# Altium schematic symbol library LATTICEPLDS_Library.SchLib: 291 symbols (part 8 of 32)
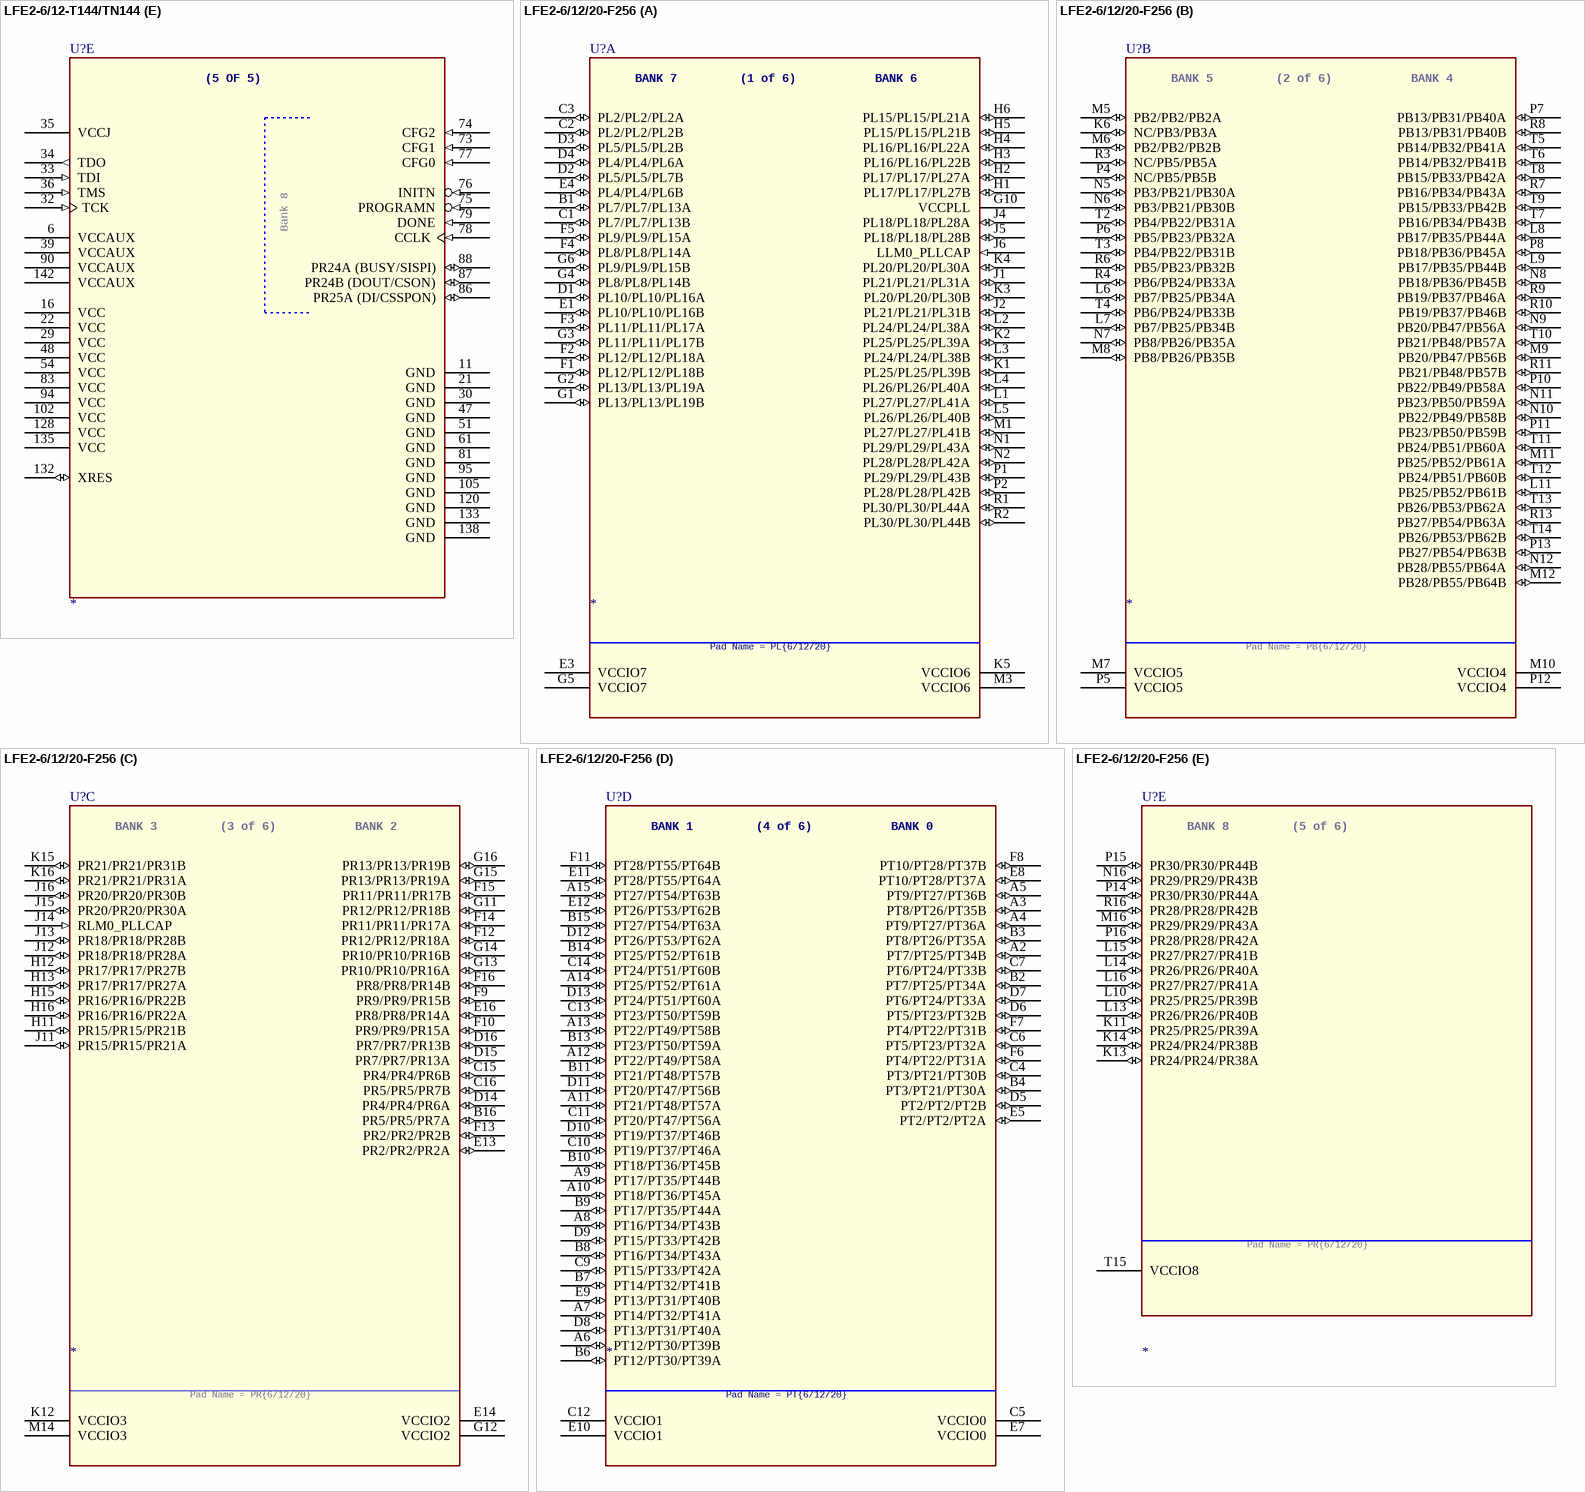
[diagram p310: symbols LFE2-6/12-T144/TN144 to LFE2-6/12/20-F256]

## LFE2-6/12-T144/TN144
designator U?
SWAP_INFO: (S1+S2+S3+S4+S5); SPLIT_INST: TRUE
part A pins: 1 PL2A (VREF2_7) (io), 2 PL2B (VREF1_7) (io), 3 PL4A (io), 4 PL4B (io), 5 PL6A (io), 7 PL6B (io), 8 PL8A (io), 9 VCCIO7 (power), 10 PL8B (io), 12 PL12A (io), 13 PL12B (io), 14 PL13A (PCLKT7_0) (io), 15 PL13B (PCLKC7_0) (io), 17 PL15A (PCLKT6_0) (io), 18 PL15B (PCLKC6_0) (io), 19 PL16A (VREF2_6) (io), 20 PL16B (VREF1_6) (io), 23 PL18A (LLM0_GDLLT_FB_A) (io), 24 PL18B (LLM0_GDLLC_FB_A) (io), 25 LLM0_PLLCAP (io), 26 PL20A (LLM0_GPLLT_IN_A**) (io), 27 PL20B (LLM0_GPLLC_IN_A**) (io), 28 PL22A (io), 31 VCCIO6 (power)
part B pins: 37 PB2A (VREF2_5) (io), 38 PB2B (VREF1_5) (io), 40 PB4A/6A (BDQS6**) (io), 41 PB4B/6B (io), 42 VCCIO5 (power), 43 PB6A (BDQS6*) /12A (io), 44 PB6B/12B (io), 45 NC/PB16A (io), 46 NC/PB16B (io), 49 PB8A/26A (PCLKT5_0) (io), 50 PB8B/26B (PCLKC5_0) (io), 52 PB13A/31A (PCLKT4_0) (io), 53 PB13B/31B (PCLKC4_0) (io), 55 PB14A/34A (io), 56 PB14B/34B (io), 57 PB16A/40A (io), 58 PB16B/40B (io), 59 PB18A/44A (io), 60 PB18B/44B (io), 62 PB20A/48A (io), 63 PB20B/48B (io), 64 VCCIO4 (power), 65 PB22A/50A (io), 66 PB22B/50B (io), 67 PB24A (BDQS24*) /52A (io), 68 PB24B/52B (io), 69 PB26A/54A (io), 70 PB26B/54B (io), 71 PB28A/55A (VREF2_4) (io), 72 PB28B/55B (VREF1_4) (io)
part C pins: 80 PR29A (D0) (io), 82 PR26A (D6) (io), 84 PR25B (D7) (io), 85 VCCIO8 (power), 89 VCCIO3 (power), 91 PR20B (RLM0_GPLLC_IN_A**) (io), 92 PR20A (RLM0_GPLLT_IN_A**) (io), 93 RLM0_PLLCAP (io), 96 PR17B (RLM0_GDLLC_IN_A**) (io), 97 PR17A (RLM0_GDLLT_IN_A**) (io), 98 PR16B (VREF2_3) (io), 99 PR16A (VREF1_3) (io), 100 PR15B (PCLKC3_0) (io), 101 PR15A (PCLKT3_0) (io), 103 PR13B (PCLKC2_0) (io), 104 PR13A (PCLKT2_0) (io), 106 VCCIO2 (power), 107 PR2B (VREF2_2) (io), 108 PR2A (VREF1_2) (io)
part D pins: 109 PT28B/55B (VREF2_1) (io), 110 PT28A/55A (VREF1_1) (io), 111 PT26B/54B (io), 112 PT26A/54A (io), 113 PT24B/52B (io), 114 PT24A/52A (io), 115 PT22B/50B (io), 116 PT22A/50A (io), 117 VCCIO1 (power), 118 PT20B/48B (io), 119 PT20A/48A (io), 121 PT18B/44B (io), 122 PT18A/44A (io), 123 PT16A/40B (io), 124 NC/PT40A (io), 125 PT14B/34B (io), 126 PT14A/34A (io), 127 NC (io), 129 PT12B/30B (PCLKC1_0) (io), 130 PT12A/30A (PCLKT1_0) (io), 131 PT10B/28B (PCLKC0_0) (io), 134 PT10A/28A (PCLKT0_0) (io), 136 PT6B/16B (io), 137 PT6A/16A (io), 139 VCCIO0 (power), 140 PT4B/T6B (io), 141 PT4A/T6A (io), 143 PT2B (VREF2_0) (io), 144 PT2A (VREF1_0) (io)
part E pins: 6 VCCAUX (power), 11 GND (power), 16 VCC (power), 21 GND (power), 22 VCC (power), 29 VCC (power), 30 GND (power), 32 TCK (in), 33 TDI (in), 34 TDO (out), 35 VCCJ (power), 36 TMS (in), 39 VCCAUX (power), 47 GND (power), 48 VCC (power), 51 GND (power), 54 VCC (power), 61 GND (power), 73 CFG1 (in), 74 CFG2 (in), 75 PROGRAMN (in), 76 INITN (in), 77 CFG0 (in), 78 CCLK (in), 79 DONE (in), 81 GND (power), 83 VCC (power), 86 PR25A (DI/CSSPON) (io), 87 PR24B (DOUT/CSON) (io), 88 PR24A (BUSY/SISPI) (io), 90 VCCAUX (power), 94 VCC (power), 95 GND (power), 102 VCC (power), 105 GND (power), 120 GND (power), 128 VCC (power), 132 XRES (io), 133 GND (power), 135 VCC (power), 138 GND (power), 142 VCCAUX (power)
part A text: BANK 7; (1 OF 5); BANK 6; ** These dedicated input pins / can be used for GPLLs or GDLLs / within the respective quadrant.; Pad name = PL{LFE2-6/LFE2-12}
part B text: BANK 5/8; (2 OF 5); BANK 4; *  LFE2-6 only. / ** LFE2-12 only.; Pad name = PB{LFE2-6/LFE2-12}
part C text: BANK 3/8; (3 OF 5); BANK 2; ** These dedicated input pins / can be used for GPLLs or GDLLs / within the respective quadrant.; Pad name = PR{EC1/EC3/EC6}
part D text: BANK 1; (4 OF 5); BANK 0; Pad name = PT{LFE2-6/LFE2-12}
part E text: (5 OF 5); Bank 8

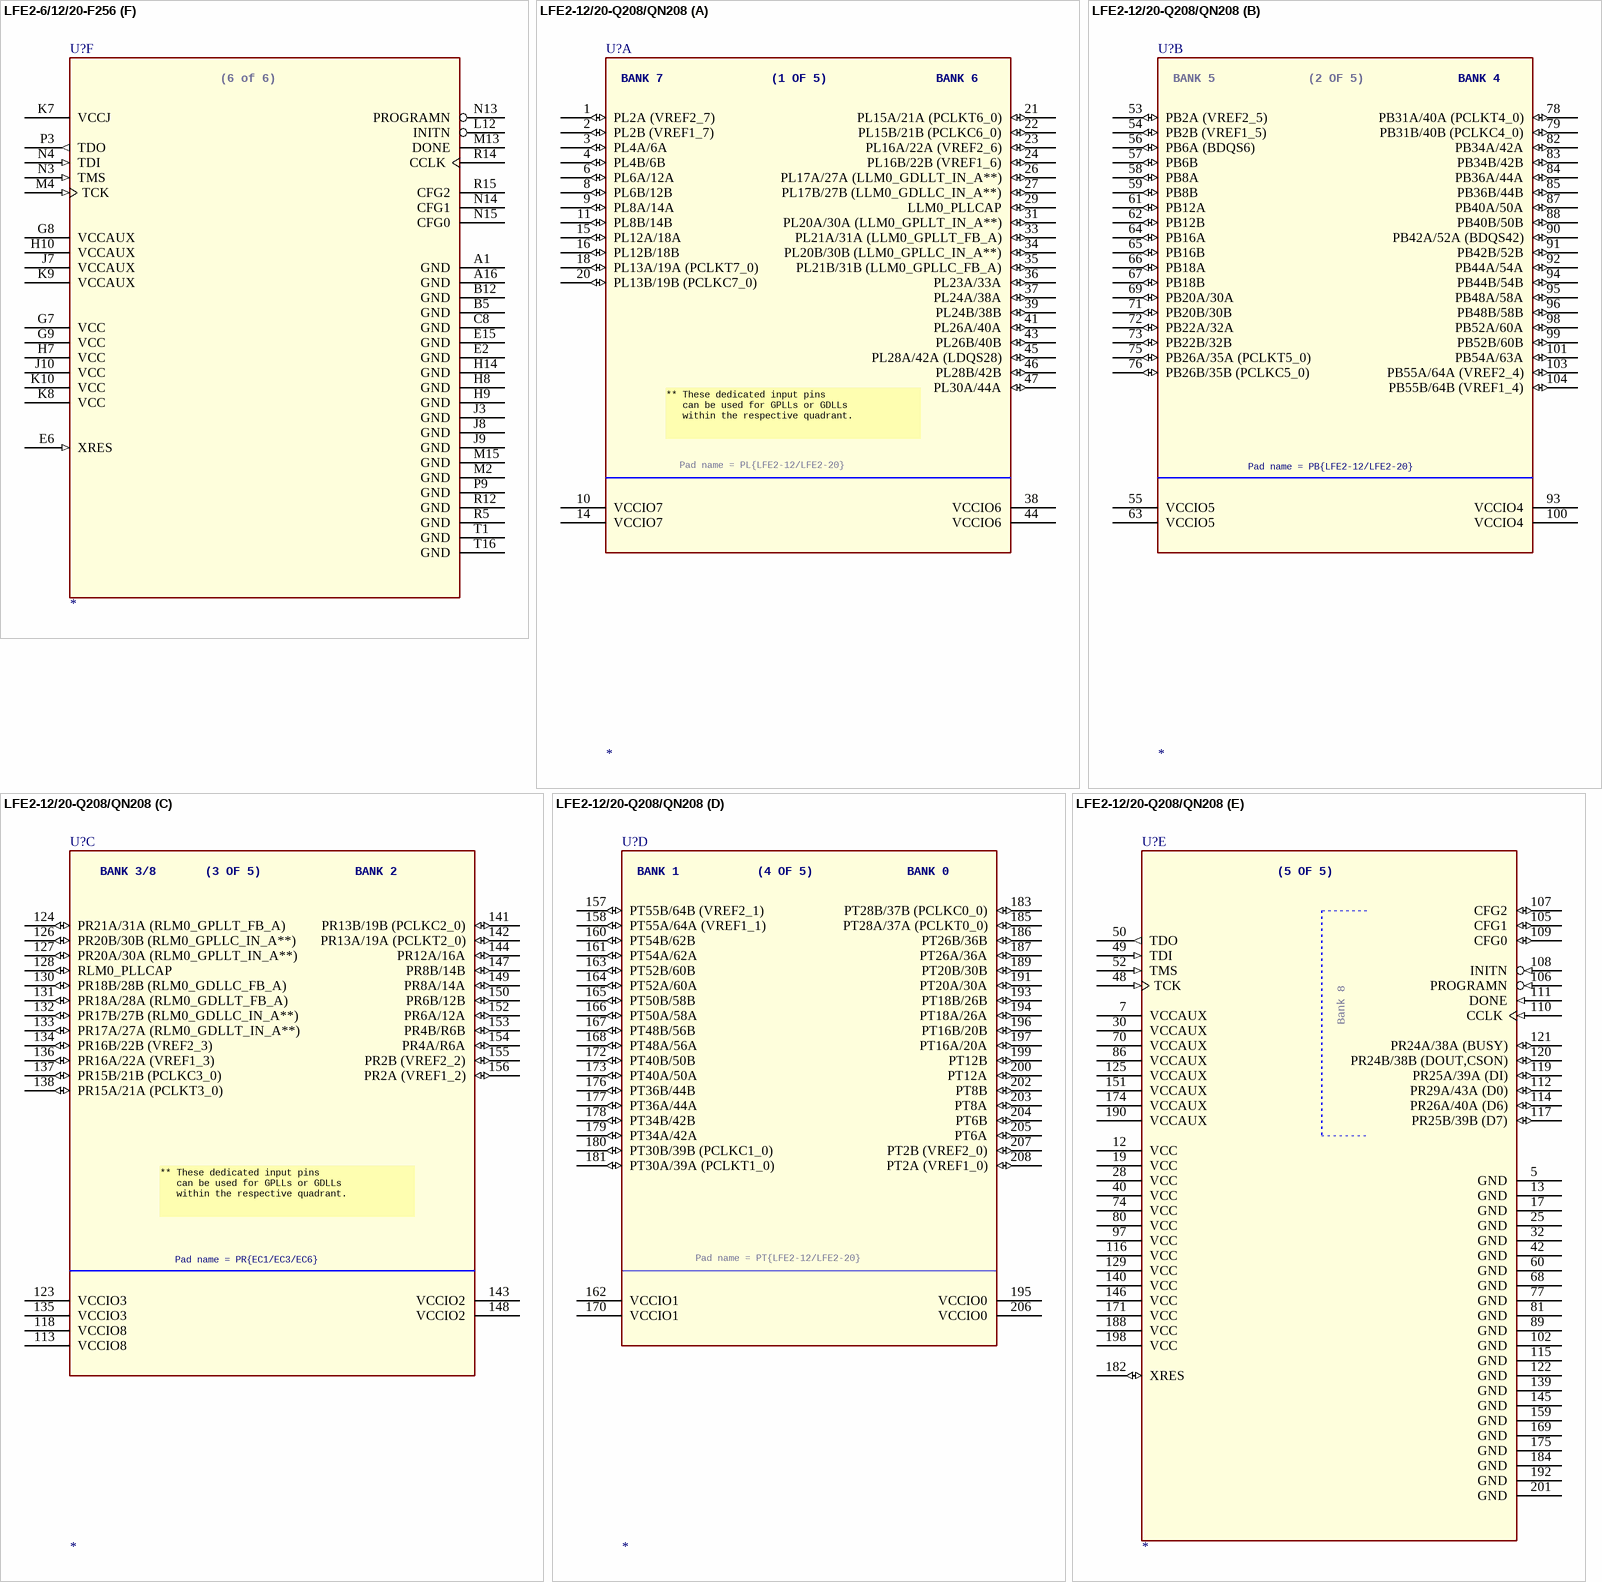
[diagram p77: symbols LFE2-6/12/20-F256 to LFE2-12/20-Q208/QN208]

## LFE2-6/12/20-F256
designator U?
SPLIT_INST: TRUE; SWAP_INFO: (S1+S2+S3+S4+S5+S6)
part A pins: B1 PL7/PL7/PL13A (io), C1 PL7/PL7/PL13B (io), C2 PL2/PL2/PL2B (io), C3 PL2/PL2/PL2A (io), D1 PL10/PL10/PL16A (io), D2 PL5/PL5/PL7B (io), D3 PL5/PL5/PL2B (io), D4 PL4/PL4/PL6A (io), E1 PL10/PL10/PL16B (io), E3 VCCIO7 (power), E4 PL4/PL4/PL6B (io), F1 PL12/PL12/PL18B (io), F2 PL12/PL12/PL18A (io), F3 PL11/PL11/PL17A (io), F4 PL8/PL8/PL14A (io), F5 PL9/PL9/PL15A (io), G1 PL13/PL13/PL19B (io), G2 PL13/PL13/PL19A (io), G3 PL11/PL11/PL17B (io), G4 PL8/PL8/PL14B (io), G5 VCCIO7 (power), G6 PL9/PL9/PL15B (io), G10 VCCPLL (power), H1 PL17/PL17/PL27B (io), H2 PL17/PL17/PL27A (io), H3 PL16/PL16/PL22B (io), H4 PL16/PL16/PL22A (io), H5 PL15/PL15/PL21B (io), H6 PL15/PL15/PL21A (io), J1 PL21/PL21/PL31A (io), J2 PL21/PL21/PL31B (io), J4 PL18/PL18/PL28A (io), J5 PL18/PL18/PL28B (io), J6 LLM0_PLLCAP (in), K1 PL25/PL25/PL39B (io), K2 PL25/PL25/PL39A (io), K3 PL20/PL20/PL30B (io), K4 PL20/PL20/PL30A (io), K5 VCCIO6 (power), L1 PL27/PL27/PL41A (io), L2 PL24/PL24/PL38A (io), L3 PL24/PL24/PL38B (io), L4 PL26/PL26/PL40A (io), L5 PL26/PL26/PL40B (io), M1 PL27/PL27/PL41B (io), M3 VCCIO6 (power), N1 PL29/PL29/PL43A (io), N2 PL28/PL28/PL42A (io), P1 PL29/PL29/PL43B (io), P2 PL28/PL28/PL42B (io), R1 PL30/PL30/PL44A (io), R2 PL30/PL30/PL44B (io)
part B pins: K6 NC/PB3/PB3A (io), L6 PB7/PB25/PB34A (io), L7 PB7/PB25/PB34B (io), L8 PB17/PB35/PB44A (io), L9 PB17/PB35/PB44B (io), L11 PB25/PB52/PB61B (io), M5 PB2/PB2/PB2A (io), M6 PB2/PB2/PB2B (io), M7 VCCIO5 (power), M8 PB8/PB26/PB35B (io), M9 PB20/PB47/PB56B (io), M10 VCCIO4 (power), M11 PB25/PB52/PB61A (io), M12 PB28/PB55/PB64B (io), N5 PB3/PB21/PB30A (io), N6 PB3/PB21/PB30B (io), N7 PB8/PB26/PB35A (io), N8 PB18/PB36/PB45B (io), N9 PB20/PB47/PB56A (io), N10 PB22/PB49/PB58B (io), N11 PB23/PB50/PB59A (io), N12 PB28/PB55/PB64A (io), P4 NC/PB5/PB5B (io), P5 VCCIO5 (power), P6 PB5/PB23/PB32A (io), P7 PB13/PB31/PB40A (io), P8 PB18/PB36/PB45A (io), P10 PB22/PB49/PB58A (io), P11 PB23/PB50/PB59B (io), P12 VCCIO4 (power), P13 PB27/PB54/PB63B (io), R3 NC/PB5/PB5A (io), R4 PB6/PB24/PB33A (io), R6 PB5/PB23/PB32B (io), R7 PB16/PB34/PB43A (io), R8 PB13/PB31/PB40B (io), R9 PB19/PB37/PB46A (io), R10 PB19/PB37/PB46B (io), R11 PB21/PB48/PB57B (io), R13 PB27/PB54/PB63A (io), T2 PB4/PB22/PB31A (io), T3 PB4/PB22/PB31B (io), T4 PB6/PB24/PB33B (io), T5 PB14/PB32/PB41A (io), T6 PB14/PB32/PB41B (io), T7 PB16/PB34/PB43B (io), T8 PB15/PB33/PB42A (io), T9 PB15/PB33/PB42B (io), T10 PB21/PB48/PB57A (io), T11 PB24/PB51/PB60A (io), T12 PB24/PB51/PB60B (io), T13 PB26/PB53/PB62A (io), T14 PB26/PB53/PB62B (io)
part C pins: B16 PR5/PR5/PR7A (io), C15 PR4/PR4/PR6B (io), C16 PR5/PR5/PR7B (io), D14 PR4/PR4/PR6A (io), D15 PR7/PR7/PR13A (io), D16 PR7/PR7/PR13B (io), E13 PR2/PR2/PR2A (io), E14 VCCIO2 (power), E16 PR8/PR8/PR14A (io), F9 PR9/PR9/PR15B (io), F10 PR9/PR9/PR15A (io), F12 PR12/PR12/PR18A (io), F13 PR2/PR2/PR2B (io), F14 PR11/PR11/PR17A (io), F15 PR11/PR11/PR17B (io), F16 PR8/PR8/PR14B (io), G11 PR12/PR12/PR18B (io), G12 VCCIO2 (power), G13 PR10/PR10/PR16A (io), G14 PR10/PR10/PR16B (io), G15 PR13/PR13/PR19A (io), G16 PR13/PR13/PR19B (io), H11 PR15/PR15/PR21B (io), H12 PR17/PR17/PR27B (io), H13 PR17/PR17/PR27A (io), H15 PR16/PR16/PR22B (io), H16 PR16/PR16/PR22A (io), J11 PR15/PR15/PR21A (io), J12 PR18/PR18/PR28A (io), J13 PR18/PR18/PR28B (io), J14 RLM0_PLLCAP (in), J15 PR20/PR20/PR30A (io), J16 PR20/PR20/PR30B (io), K12 VCCIO3 (power), K15 PR21/PR21/PR31B (io), K16 PR21/PR21/PR31A (io), M14 VCCIO3 (power)
part D pins: A2 PT7/PT25/PT34B (io), A3 PT8/PT26/PT35B (io), A4 PT9/PT27/PT36A (io), A5 PT9/PT27/PT36B (io), A6 PT12/PT30/PT39B (io), A7 PT14/PT32/PT41A (io), A8 PT16/PT34/PT43B (io), A9 PT17/PT35/PT44B (io), A10 PT18/PT36/PT45A (io), A11 PT21/PT48/PT57A (io), A12 PT22/PT49/PT58A (io), A13 PT22/PT49/PT58B (io), A14 PT25/PT52/PT61A (io), A15 PT27/PT54/PT63B (io), B2 PT7/PT25/PT34A (io), B3 PT8/PT26/PT35A (io), B4 PT3/PT21/PT30A (io), B6 PT12/PT30/PT39A (io), B7 PT14/PT32/PT41B (io), B8 PT16/PT34/PT43A (io), B9 PT17/PT35/PT44A (io), B10 PT18/PT36/PT45B (io), B11 PT21/PT48/PT57B (io), B13 PT23/PT50/PT59A (io), B14 PT25/PT52/PT61B (io), B15 PT27/PT54/PT63A (io), C4 PT3/PT21/PT30B (io), C5 VCCIO0 (power), C6 PT5/PT23/PT32A (io), C7 PT6/PT24/PT33B (io), C9 PT15/PT33/PT42A (io), C10 PT19/PT37/PT46A (io), C11 PT20/PT47/PT56A (io), C12 VCCIO1 (power), C13 PT23/PT50/PT59B (io), C14 PT24/PT51/PT60B (io), D5 PT2/PT2/PT2B (io), D6 PT5/PT23/PT32B (io), D7 PT6/PT24/PT33A (io), D8 PT13/PT31/PT40A (io), D9 PT15/PT33/PT42B (io), D10 PT19/PT37/PT46B (io), D11 PT20/PT47/PT56B (io), D12 PT26/PT53/PT62A (io), D13 PT24/PT51/PT60A (io), E5 PT2/PT2/PT2A (io), E7 VCCIO0 (power), E8 PT10/PT28/PT37A (io), E9 PT13/PT31/PT40B (io), E10 VCCIO1 (power), E11 PT28/PT55/PT64A (io), E12 PT26/PT53/PT62B (io), F6 PT4/PT22/PT31A (io), F7 PT4/PT22/PT31B (io), F8 PT10/PT28/PT37B (io), F11 PT28/PT55/PT64B (io)
part E pins: K11 PR25/PR25/PR39A (io), K13 PR24/PR24/PR38A (io), K14 PR24/PR24/PR38B (io), L10 PR25/PR25/PR39B (io), L13 PR26/PR26/PR40B (io), L14 PR26/PR26/PR40A (io), L15 PR27/PR27/PR41B (io), L16 PR27/PR27/PR41A (io), M16 PR29/PR29/PR43A (io), N16 PR29/PR29/PR43B (io), P14 PR30/PR30/PR44A (io), P15 PR30/PR30/PR44B (io), P16 PR28/PR28/PR42A (io), R16 PR28/PR28/PR42B (io), T15 VCCIO8 (power)
part F pins: A1 GND (power), A16 GND (power), B5 GND (power), B12 GND (power), C8 GND (power), E2 GND (power), E6 XRES (in), E15 GND (power), G7 VCC (power), G8 VCCAUX (power), G9 VCC (power), H7 VCC (power), H8 GND (power), H9 GND (power), H10 VCCAUX (power), H14 GND (power), J3 GND (power), J7 VCCAUX (power), J8 GND (power), J9 GND (power), J10 VCC (power), K7 VCCJ (power), K8 VCC (power), K9 VCCAUX (power), K10 VCC (power), L12 INITN, M2 GND (power), M4 TCK (in), M13 DONE, M15 GND (power), N3 TMS (in), N4 TDI (in), N13 PROGRAMN, N14 CFG1, N15 CFG0, P3 TDO (out), P9 GND (power), R5 GND (power), R12 GND (power), R14 CCLK, R15 CFG2, T1 GND (power), T16 GND (power)
part A text: BANK 7; (1 of 6); BANK 6; Pad Name = PL{6/12/20}
part B text: BANK 5; (2 of 6); BANK 4; Pad Name = PB{6/12/20}
part C text: BANK 3; (3 of 6); BANK 2; Pad Name = PR{6/12/20}
part D text: BANK 1; (4 of 6); BANK 0; Pad Name = PT{6/12/20}
part E text: BANK 8; (5 of 6); Pad Name = PR{6/12/20}
part F text: (6 of 6)

## LFE2-12/20-Q208/QN208
designator U?
SWAP_INFO: (S1+S2+S3+S4+S5); SPLIT_INST: TRUE
part A pins: 1 PL2A (VREF2_7) (io), 2 PL2B (VREF1_7) (io), 3 PL4A/6A (io), 4 PL4B/6B (io), 6 PL6A/12A (io), 8 PL6B/12B (io), 9 PL8A/14A (io), 10 VCCIO7 (power), 11 PL8B/14B (io), 14 VCCIO7 (power), 15 PL12A/18A (io), 16 PL12B/18B (io), 18 PL13A/19A (PCLKT7_0) (io), 20 PL13B/19B (PCLKC7_0) (io), 21 PL15A/21A (PCLKT6_0) (io), 22 PL15B/21B (PCLKC6_0) (io), 23 PL16A/22A (VREF2_6) (io), 24 PL16B/22B (VREF1_6) (io), 26 PL17A/27A (LLM0_GDLLT_IN_A**) (io), 27 PL17B/27B (LLM0_GDLLC_IN_A**) (io), 29 LLM0_PLLCAP (io), 31 PL20A/30A (LLM0_GPLLT_IN_A**) (io), 33 PL21A/31A (LLM0_GPLLT_FB_A) (io), 34 PL20B/30B (LLM0_GPLLC_IN_A**) (io), 35 PL21B/31B (LLM0_GPLLC_FB_A) (io), 36 PL23A/33A (io), 37 PL24A/38A (io), 38 VCCIO6 (power), 39 PL24B/38B (io), 41 PL26A/40A (io), 43 PL26B/40B (io), 44 VCCIO6 (power), 45 PL28A/42A (LDQS28) (io), 46 PL28B/42B (io), 47 PL30A/44A (io)
part B pins: 53 PB2A (VREF2_5) (io), 54 PB2B (VREF1_5) (io), 55 VCCIO5 (power), 56 PB6A (BDQS6) (io), 57 PB6B (io), 58 PB8A (io), 59 PB8B (io), 61 PB12A (io), 62 PB12B (io), 63 VCCIO5 (power), 64 PB16A (io), 65 PB16B (io), 66 PB18A (io), 67 PB18B (io), 69 PB20A/30A (io), 71 PB20B/30B (io), 72 PB22A/32A (io), 73 PB22B/32B (io), 75 PB26A/35A (PCLKT5_0) (io), 76 PB26B/35B (PCLKC5_0) (io), 78 PB31A/40A (PCLKT4_0) (io), 79 PB31B/40B (PCLKC4_0) (io), 82 PB34A/42A (io), 83 PB34B/42B (io), 84 PB36A/44A (io), 85 PB36B/44B (io), 87 PB40A/50A (io), 88 PB40B/50B (io), 90 PB42A/52A (BDQS42) (io), 91 PB42B/52B (io), 92 PB44A/54A (io), 93 VCCIO4 (power), 94 PB44B/54B (io), 95 PB48A/58A (io), 96 PB48B/58B (io), 98 PB52A/60A (io), 99 PB52B/60B (io), 100 VCCIO4 (power), 101 PB54A/63A (io), 103 PB55A/64A (VREF2_4) (io), 104 PB55B/64B (VREF1_4) (io)
part C pins: 113 VCCIO8 (power), 118 VCCIO8 (power), 123 VCCIO3 (power), 124 PR21A/31A (RLM0_GPLLT_FB_A) (io), 126 PR20B/30B (RLM0_GPLLC_IN_A**) (io), 127 PR20A/30A (RLM0_GPLLT_IN_A**) (io), 128 RLM0_PLLCAP (io), 130 PR18B/28B (RLM0_GDLLC_FB_A) (io), 131 PR18A/28A (RLM0_GDLLT_FB_A) (io), 132 PR17B/27B (RLM0_GDLLC_IN_A**) (io), 133 PR17A/27A (RLM0_GDLLT_IN_A**) (io), 134 PR16B/22B (VREF2_3) (io), 135 VCCIO3 (power), 136 PR16A/22A (VREF1_3) (io), 137 PR15B/21B (PCLKC3_0) (io), 138 PR15A/21A (PCLKT3_0) (io), 141 PR13B/19B (PCLKC2_0) (io), 142 PR13A/19A (PCLKT2_0) (io), 143 VCCIO2 (power), 144 PR12A/16A (io), 147 PR8B/14B (io), 148 VCCIO2 (power), 149 PR8A/14A (io), 150 PR6B/12B (io), 152 PR6A/12A (io), 153 PR4B/R6B (io), 154 PR4A/R6A (io), 155 PR2B (VREF2_2) (io), 156 PR2A (VREF1_2) (io)
part D pins: 157 PT55B/64B (VREF2_1) (io), 158 PT55A/64A (VREF1_1) (io), 160 PT54B/62B (io), 161 PT54A/62A (io), 162 VCCIO1 (power), 163 PT52B/60B (io), 164 PT52A/60A (io), 165 PT50B/58B (io), 166 PT50A/58A (io), 167 PT48B/56B (io), 168 PT48A/56A (io), 170 VCCIO1 (power), 172 PT40B/50B (io), 173 PT40A/50A (io), 176 PT36B/44B (io), 177 PT36A/44A (io), 178 PT34B/42B (io), 179 PT34A/42A (io), 180 PT30B/39B (PCLKC1_0) (io), 181 PT30A/39A (PCLKT1_0) (io), 183 PT28B/37B (PCLKC0_0) (io), 185 PT28A/37A (PCLKT0_0) (io), 186 PT26B/36B (io), 187 PT26A/36A (io), 189 PT20B/30B (io), 191 PT20A/30A (io), 193 PT18B/26B (io), 194 PT18A/26A (io), 195 VCCIO0 (power), 196 PT16B/20B (io), 197 PT16A/20A (io), 199 PT12B (io), 200 PT12A (io), 202 PT8B (io), 203 PT8A (io), 204 PT6B (io), 205 PT6A (io), 206 VCCIO0 (power), 207 PT2B (VREF2_0) (io), 208 PT2A (VREF1_0) (io)
part E pins: 5 GND (power), 7 VCCAUX (power), 12 VCC (power), 13 GND (power), 17 GND (power), 19 VCC (power), 25 GND (power), 28 VCC (power), 30 VCCAUX (power), 32 GND (power), 40 VCC (power), 42 GND (power), 48 TCK (in), 49 TDI (in), 50 TDO (out), 51 VCCJ (power) hidden, 52 TMS (in), 60 GND (power), 68 GND (power), 70 VCCAUX (power), 74 VCC (power), 77 GND (power), 80 VCC (power), 81 GND (power), 86 VCCAUX (power), 89 GND (power), 97 VCC (power), 102 GND (power), 105 CFG1 (io), 106 PROGRAMN (in), 107 CFG2 (io), 108 INITN (in), 109 CFG0 (io), 110 CCLK (in), 111 DONE (in), 112 PR29A/43A (D0) (io), 114 PR26A/40A (D6) (io), 115 GND (power), 116 VCC (power), 117 PR25B/39B (D7) (io), 119 PR25A/39A (DI) (io), 120 PR24B/38B (DOUT,CSON) (io), 121 PR24A/38A (BUSY) (io), 122 GND (power), 125 VCCAUX (power), 129 VCC (power), 139 GND (power), 140 VCC (power), 145 GND (power), 146 VCC (power), 151 VCCAUX (power), 159 GND (power), 169 GND (power), 171 VCC (power), 174 VCCAUX (power), 175 GND (power), 182 XRES (io), 184 GND (power), 188 VCC (power), 190 VCCAUX (power), 192 GND (power), 198 VCC (power), 201 GND (power)

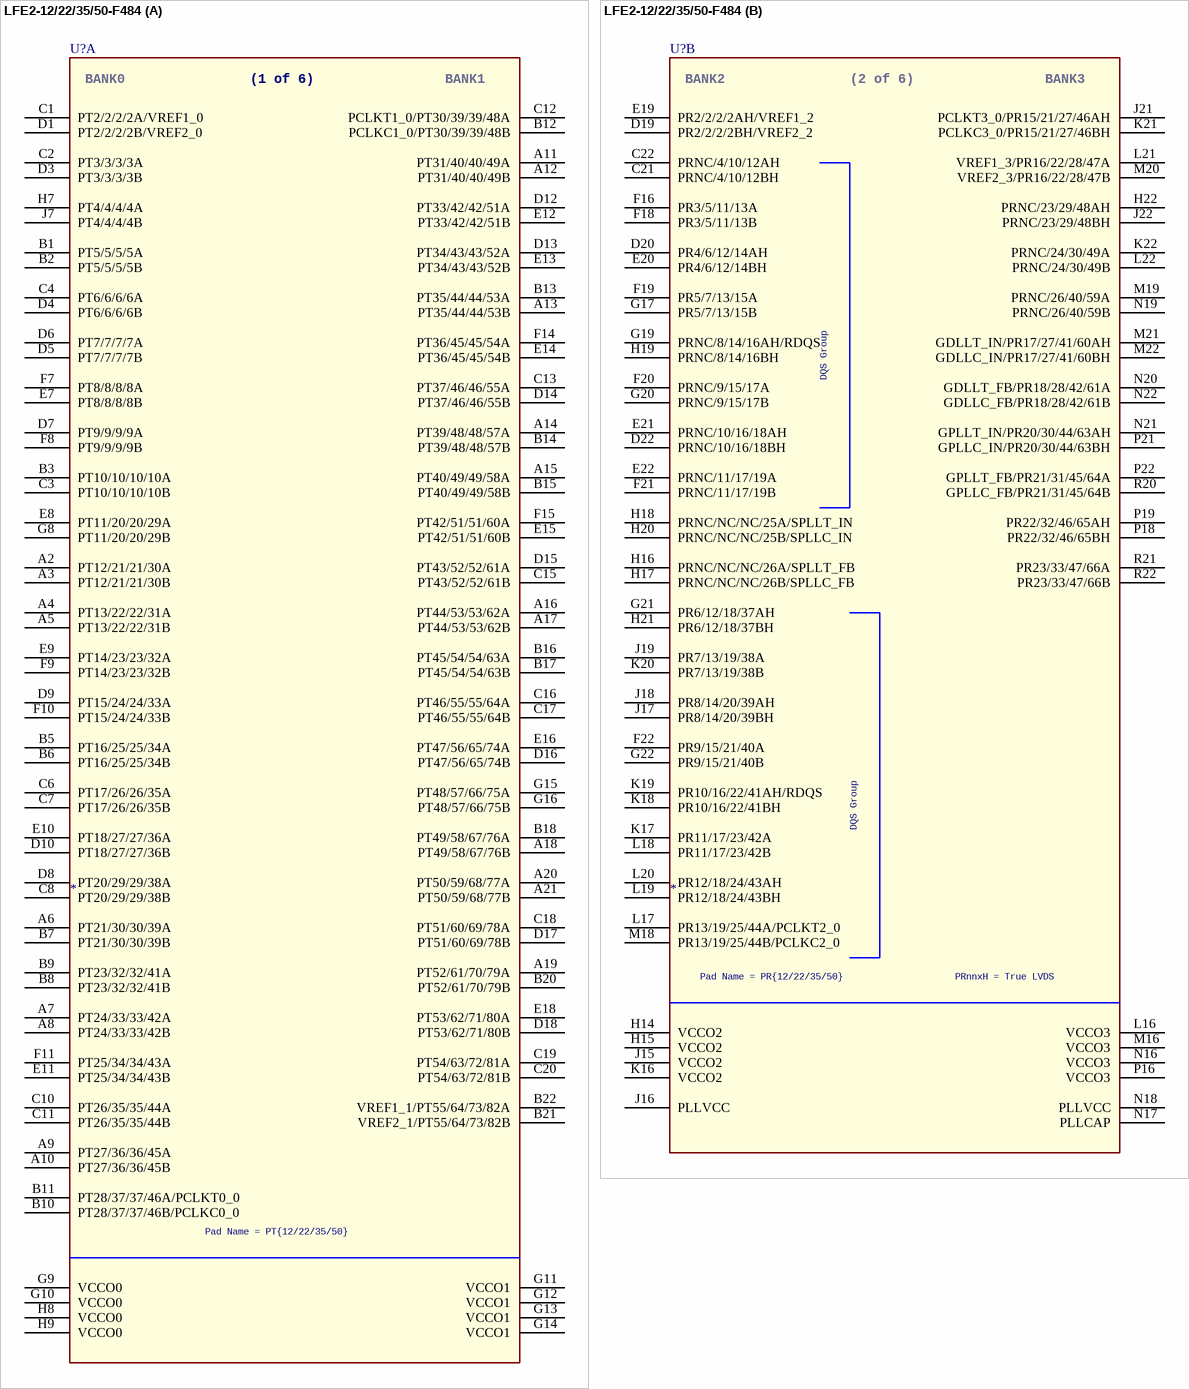
[diagram p78: symbol LFE2-12/22/35/50-F484]

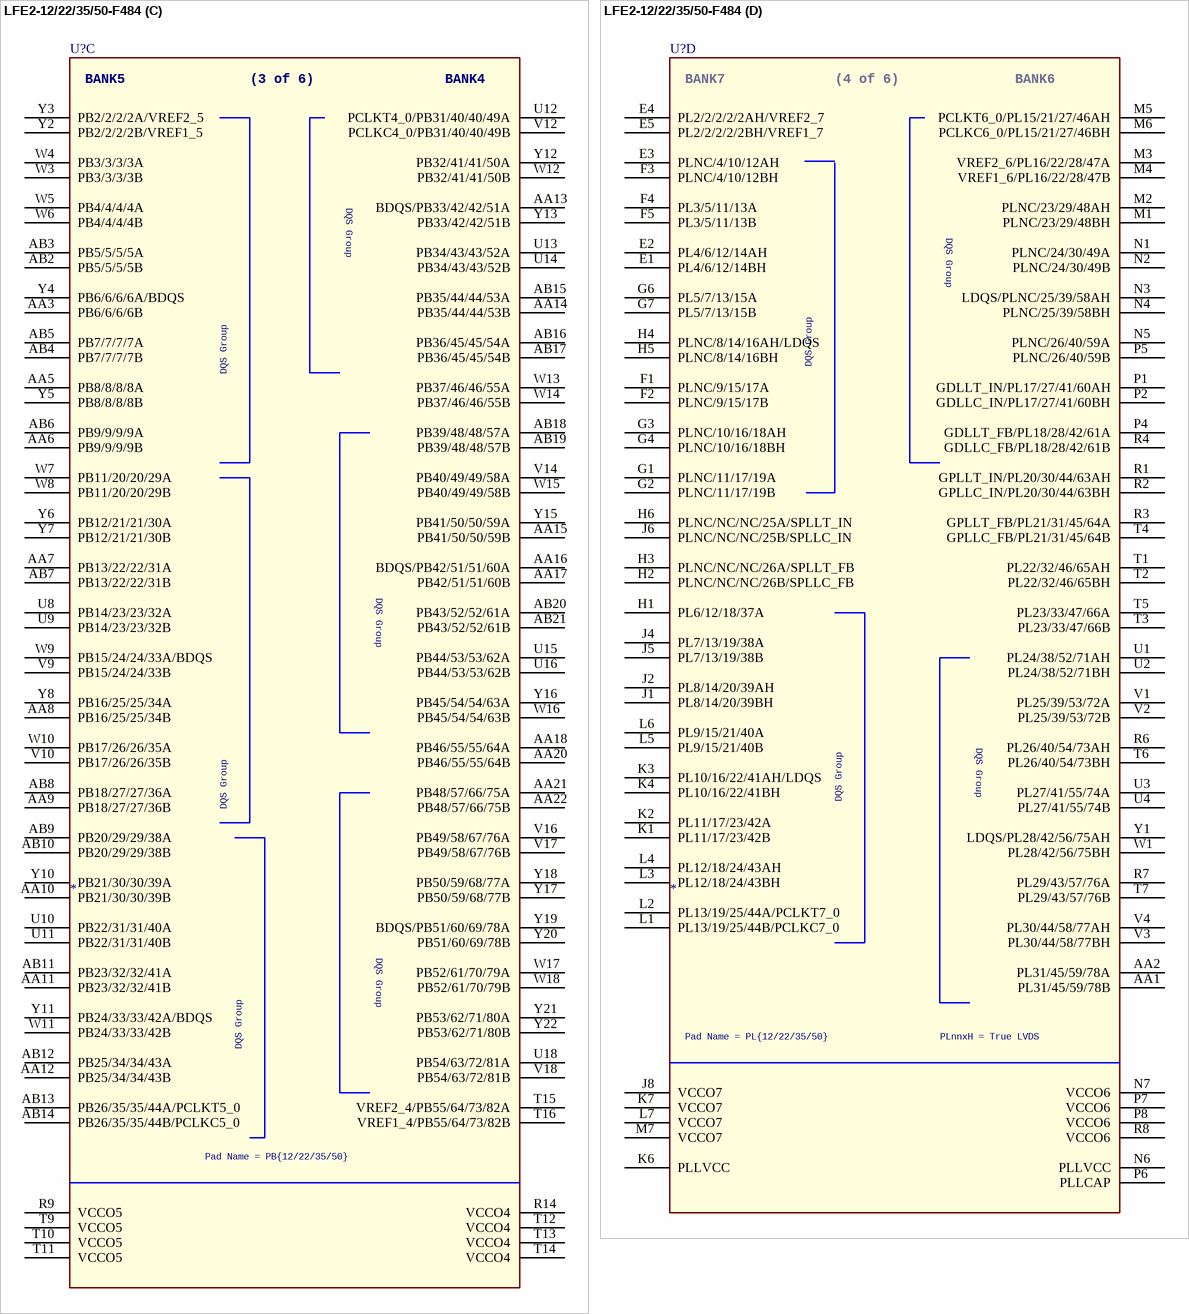
[diagram p79: symbol LFE2-12/22/35/50-F484]
